# Altium footprint library miniFOC-foc_pcblib.PcbLib: 55 footprints (part 4 of 4)
Each footprint in its own frame and in the unit in brackets; x right, y up, seen from the top. Pads: shape width x height; smd on the part's side, far side on the other; paste and mask are expansions set on the pad; w line width, h text height; cw(c..) or ccw(c..) is an arc to the next point about the centre after c.
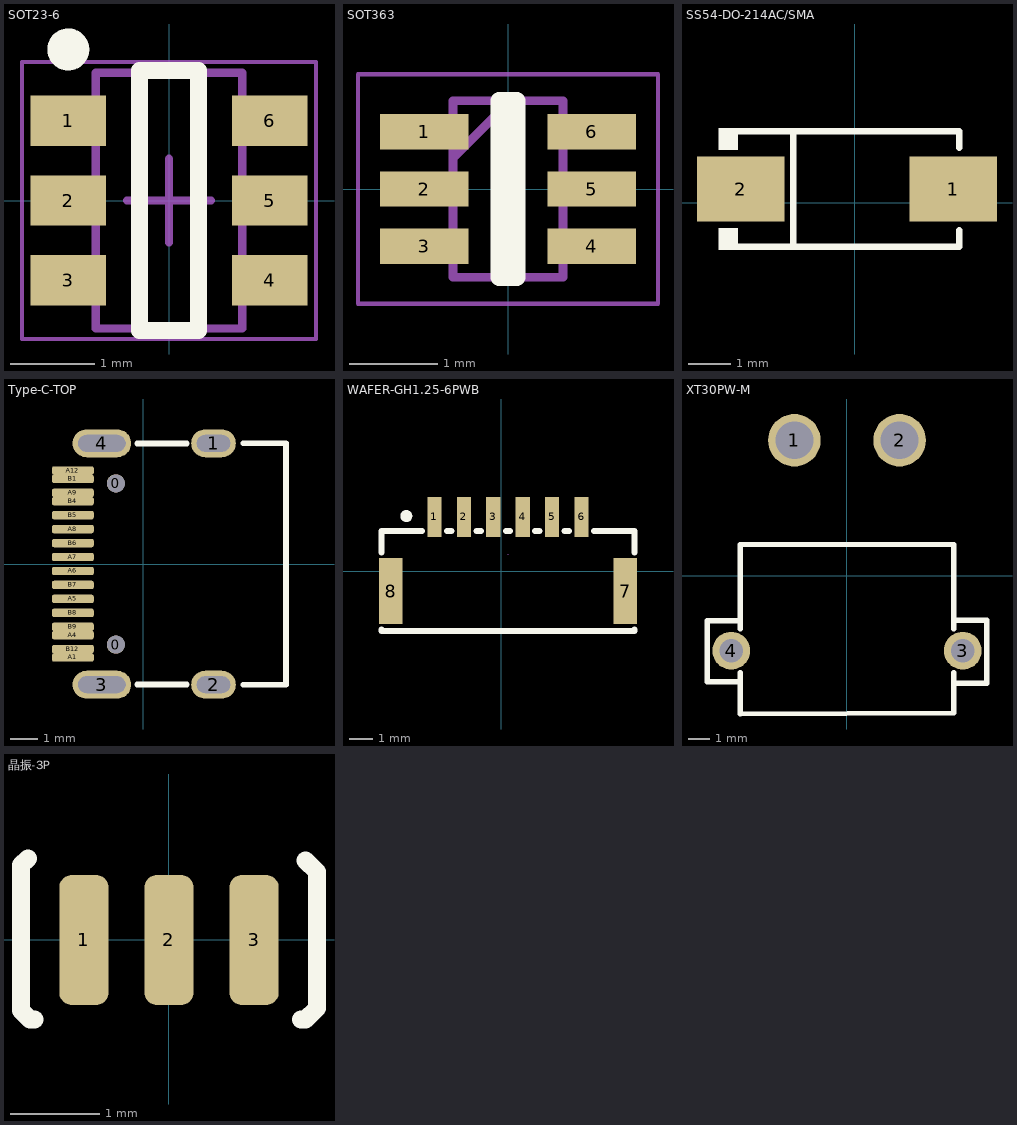
[diagram p3: the footprints below, top view; thin cyan lines are the x and y axes]

## SOT23-6 [mm] "SOT-23, 6-Leads, Body 2.90x1.60mm, Pitch 0.95mm, IPC High Density"
height 1.45
pads (6):
  rect 0.9x0.6 smd: 1(-1.2,0.95) 2(-1.2,0) 3(-1.2,-0.95) 4(1.2,-0.95) 5(1.2,0) 6(1.2,0.95)
Top Overlay:
  circle w0.25: c-1.2,1.8 r0.125
  lines w0.2: -0.35,-1.55 -0.35,1.55 0.35,1.55 0.35,-1.55 -0.35,-1.55
Mechanical 13:
  lines w0.1: -0.875,-1.525 0.875,-1.525 0.875,1.525 -0.875,1.525 -0.875,-1.525
Mechanical 15:
  lines w0.05: -1.75,-1.65 1.75,-1.65 1.75,1.65 -1.75,1.65 -1.75,-1.65
  lines w0.1: -0.5,0 0.5,0 ; 0,-0.5 0,0.5
3D body "SOT23-6.STEP": height 1.15, standoff -0.03, extent -1.403,-1.5 1.403,1.5

## SOT363 [mm]
pads (6):
  rect 1x0.4 smd: 1(-0.95,0.65) 2(-0.95,0) 3(-0.95,-0.65) 4(0.95,-0.65) 5(0.95,0) 6(0.95,0.65)
Top Overlay:
  lines w0.2: -0.1,-1 -0.1,1 0.1,1 0.1,-1 -0.1,-1
Mechanical 13:
  lines w0.1: -0.625,0.35 0.025,1 ; -0.625,-1 -0.625,1 0.625,1 0.625,-1 -0.625,-1
Mechanical 15:
  lines w0.05: -1.7,-1.3 -1.7,1.3 1.7,1.3 1.7,-1.3 -1.7,-1.3
3D body "SMF05C.stp": height 1.1, standoff 0, extent -1.05,-1 1.05,1

## SS54-DO-214AC/SMA [mm] "Molded Diode, 2-Leads, Body 4.31x3.62mm, IPC Low Density"
height 2.44
pads (2):
  rect 2.063x1.539 smd: 1(2.32,0.325) 2(-2.688,0.325)
Top Overlay:
  region: -2.754,-1.107 -2.754,-0.596 -3.211,-0.596 -3.211,-1.107
  region: -2.754,1.758 -2.754,1.247 -3.211,1.247 -3.211,1.758
  lines w0.152: -2.83,-1.031 2.462,-1.031 2.462,-0.647 ; -2.83,1.682 2.462,1.682 2.462,1.298 ; -1.453,-1.031 -1.453,1.682
Mechanical 15:
  region: 1.906,-0.315 1.906,0.965 1.714,0.965 1.714,-0.315
  region: 2.194,0.229 2.194,0.421 1.426,0.421 1.426,0.229
  region: -2.562,0.229 -2.562,0.421 -1.794,0.421 -1.794,0.229
3D body "SS54FSH.STEP": height 1.1, standoff 0, extent -2.536,-0.921 2.164,1.578

## Type-C-TOP [mm]
pads (22):
  round 0.65 hole 0.65: 0(-0.98,-2.89) 0(-0.98,2.89)
  oval 1.6x1 hole 0.6 slot 1.2 at 0 deg: 1(2.52,4.325) 2(2.52,-4.325)
  oval 2.1x1 hole 0.6 slot 1.7 at 0 deg: 3(-1.48,-4.325) 4(-1.48,4.325)
  rrect50% 1.5x0.3 smd: A1(-2.52,-3.35) A4(-2.52,-2.55) A5(-2.52,-1.25) A6(-2.52,-0.25) A7(-2.52,0.25) A8(-2.52,1.25) A9(-2.52,2.55) A12(-2.52,3.35) B1(-2.52,3.05) B4(-2.52,2.25) B5(-2.52,1.75) B6(-2.52,0.75) B7(-2.52,-0.75) B8(-2.52,-1.75) B9(-2.52,-2.25) B12(-2.52,-3.05)
Top Overlay:
  lines w0.203: -0.218,-4.318 1.56,-4.318 ; -0.218,4.318 1.56,4.318 ; 3.592,-4.325 5.12,-4.325 5.12,4.325 3.592,4.325
3D body "1.step": height 3.26, standoff -1, extent -2.568,-4.475 5.182,4.475

## WAFER-GH1.25-6PWB [mm]
pads (8):
  rect 0.6x1.7 smd: 1(-2.83,2.307) 2(-1.58,2.307) 3(-0.33,2.307) 4(0.92,2.307) 5(2.17,2.307) 6(3.42,2.307)
  rect 1x2.8 smd: 7(5.27,-0.843) 8(-4.68,-0.843)
Top Overlay:
  circle w0.254: c-4.027,2.345 r0.127
  lines w0.254: -5.08,-2.474 -5.08,-2.54 5.67,-2.54 5.67,-2.474 ; -5.08,0.788 -5.08,1.71 -3.361,1.71 ; -2.299,1.71 -2.111,1.71 ; -1.049,1.71 -0.861,1.71 ; 0.201,1.71 0.389,1.71 ; 1.451,1.71 1.639,1.71 ; 2.701,1.71 2.889,1.71 ; 3.951,1.71 5.67,1.71 5.67,0.788
Mechanical 15:
  lines w0.003: 0.295,0.724 0.295,0.725
3D body "JST - GH - SMD (R) - 6Pin - 1.25mm.stp": height 3.53, standoff 0, extent -6.16,-2.667 6.668,2.68

## XT30PW-M [mm]
pads (4):
  round 2.5 hole 1.8: 1(-2.5,6.436) 2(2.5,6.436)
  round 1.8 hole 1.1: 3(5.5,-3.564) 4(-5.5,-3.564)
Top Overlay:
  lines w0.254: -5.08,-5.044 -6.65,-5.044 -6.65,-2.149 -5.08,-2.149 ; -5.08,-4.614 -5.08,-6.573 5.08,-6.528 5.08,-4.614 ; -5.08,-2.514 -5.08,1.483 5.08,1.483 5.08,-2.514 ; 5.08,-5.114 6.65,-5.114 6.65,-2.123 5.08,-2.123
3D body "XT30PW-M.STEP": height 5, standoff -2, extent -6.625,-6.506 6.675,7.444

## 晶振-3P [mm] "贴片晶振"
height 4.3
pads (3):
  rrect50% 0.55x1.45 smd: 1(-0.95,0) 2(0,0) 3(0.95,0)
Top Overlay:
  lines w0.2: -1.576,0.911 -1.651,0.836 -1.651,-0.789 -1.551,-0.889 -1.501,-0.889 ; 1.474,-0.889 1.524,-0.889 1.651,-0.762 1.651,0.762 1.524,0.889
3D body "123123123.stp": height 0.7, standoff 0, extent -1.6,-0.65 1.6,0.65
3D body: height 0, standoff 0, extent 1.474,-0.89 1.652,0.89
3D body: height 0, standoff 0, extent 1.474,-0.89 1.652,0.89